# Altium footprint library EMDC_Packages.PcbLib: 274 footprints (part 7 of 18)
Each footprint in its own frame and in the unit in brackets; x right, y up, seen from the top. Pads: shape width x height; smd on the part's side, far side on the other; paste and mask are expansions set on the pad; w line width, h text height; cw(c..) or ccw(c..) is an arc to the next point about the centre after c.
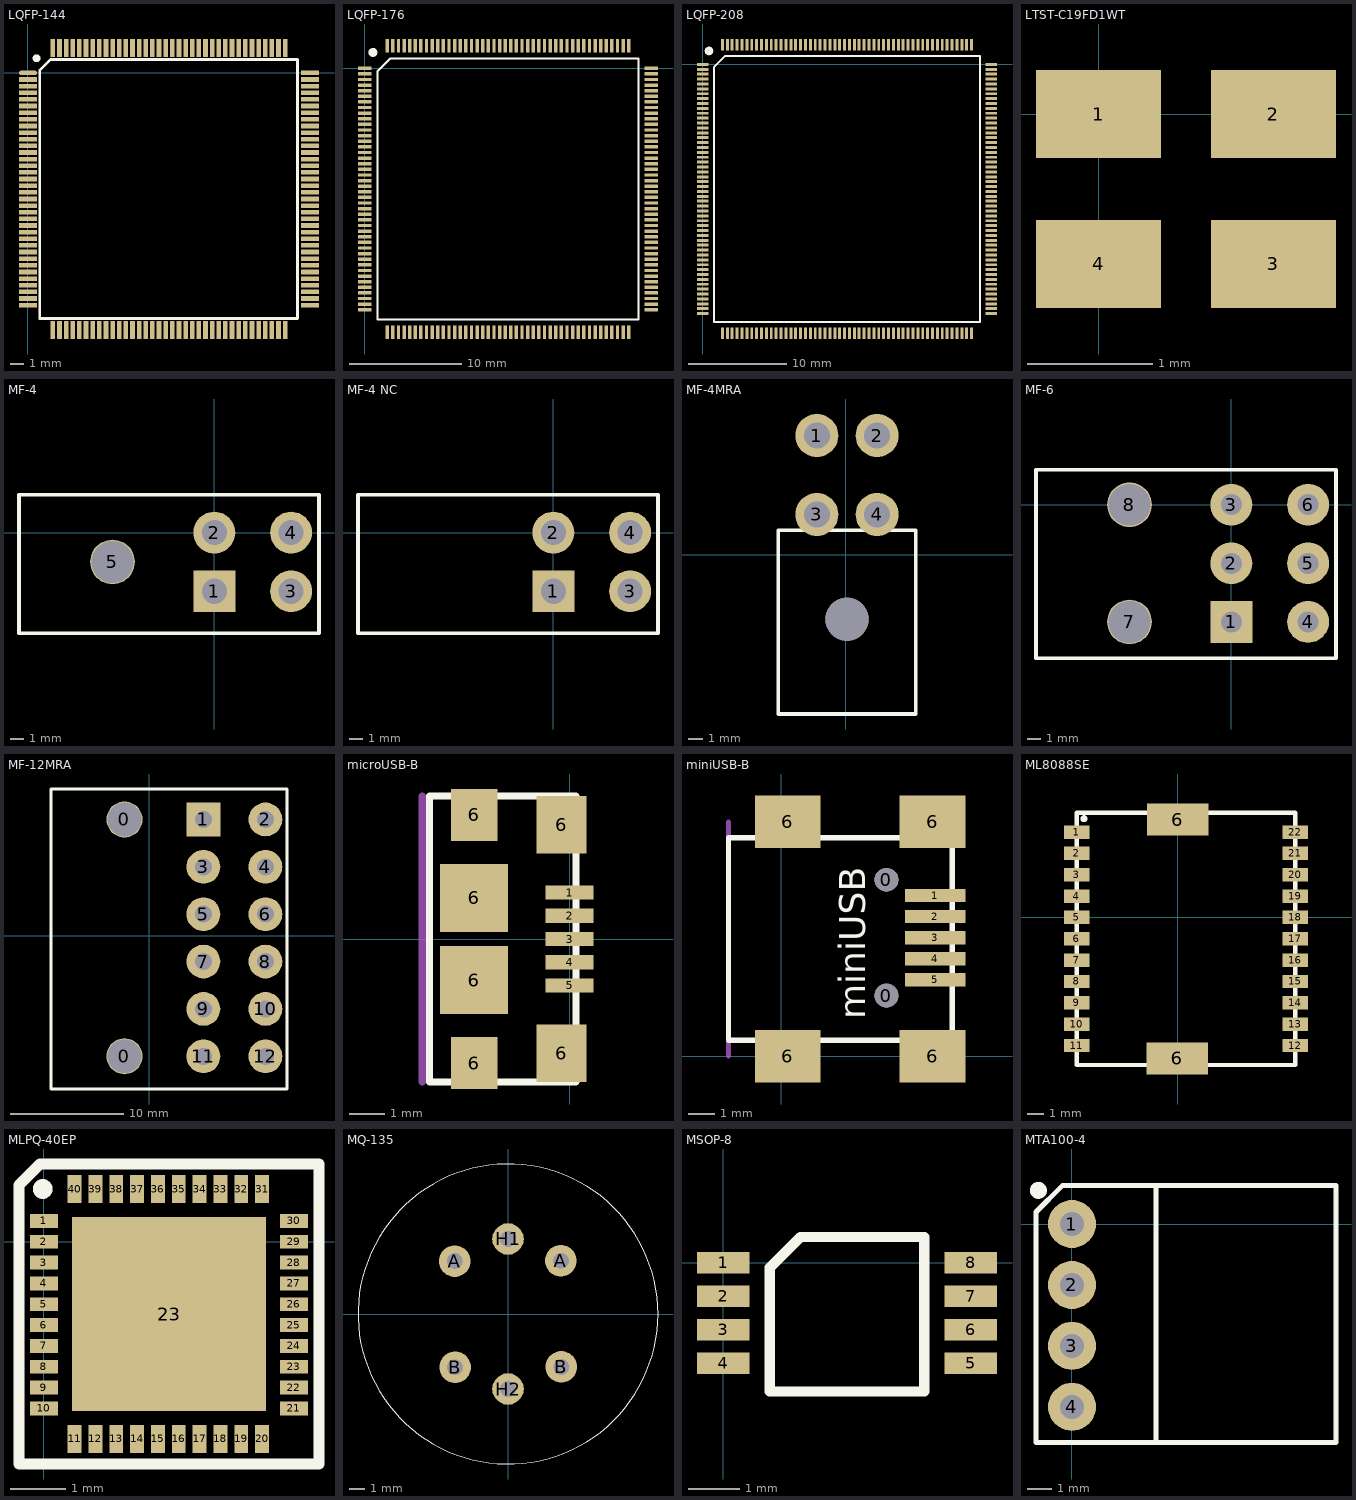
[diagram p6: the footprints below, top view; thin cyan lines are the x and y axes]

## LQFP-144 [mm]
pads (144):
  oval 1.35x0.35 smd: 1(0,0)
  rect 1.35x0.35 smd: 2(0,-0.5) 3(0,-1) 4(0,-1.5) 5(0,-2) 6(0,-2.5) 7(0,-3) 8(0,-3.5) 9(0,-4) 10(0,-4.5) 11(0,-5) 12(0,-5.5) 13(0,-6) 14(0,-6.5) 15(0,-7) 16(0,-7.5) 17(0,-8) 18(0,-8.5) 19(0,-9) 20(0,-9.5) 21(0,-10) 22(0,-10.5) 23(0,-11) 24(0,-11.5) 25(0,-12) 26(0,-12.5) 27(0,-13) 28(0,-13.5) 29(0,-14) 30(0,-14.5) 31(0,-15) 32(0,-15.5) 33(0,-16) 34(0,-16.5) 35(0,-17) 36(0,-17.5) 73(21.25,-17.5) 74(21.25,-17) 75(21.25,-16.5) 76(21.25,-16) 77(21.25,-15.5) 78(21.25,-15) 79(21.25,-14.5) 80(21.25,-14) 81(21.25,-13.5) 82(21.25,-13) 83(21.25,-12.5) 84(21.25,-12) 85(21.25,-11.5) 86(21.25,-11) 87(21.25,-10.5) 88(21.25,-10) 89(21.25,-9.5) 90(21.25,-9) 91(21.25,-8.5) 92(21.25,-8) 93(21.25,-7.5) 94(21.25,-7) 95(21.25,-6.5) 96(21.25,-6) 97(21.25,-5.5) 98(21.25,-5) 99(21.25,-4.5) 100(21.25,-4) 101(21.25,-3.5) 102(21.25,-3) 103(21.25,-2.5) 104(21.25,-2) 105(21.25,-1.5) 106(21.25,-1) 107(21.25,-0.5) 108(21.25,0)
  rect 0.35x1.35 smd: 37(1.875,-19.375) 38(2.375,-19.375) 39(2.875,-19.375) 40(3.375,-19.375) 41(3.875,-19.375) 42(4.375,-19.375) 43(4.875,-19.375) 44(5.375,-19.375) 45(5.875,-19.375) 46(6.375,-19.375) 47(6.875,-19.375) 48(7.375,-19.375) 49(7.875,-19.375) 50(8.375,-19.375) 51(8.875,-19.375) 52(9.375,-19.375) 53(9.875,-19.375) 54(10.375,-19.375) 55(10.875,-19.375) 56(11.375,-19.375) 57(11.875,-19.375) 58(12.375,-19.375) 59(12.875,-19.375) 60(13.375,-19.375) 61(13.875,-19.375) 62(14.375,-19.375) 63(14.875,-19.375) 64(15.375,-19.375) 65(15.875,-19.375) 66(16.375,-19.375) 67(16.875,-19.375) 68(17.375,-19.375) 69(17.875,-19.375) 70(18.375,-19.375) 71(18.875,-19.375) 72(19.375,-19.375) 109(19.375,1.875) 110(18.875,1.875) 111(18.375,1.875) 112(17.875,1.875) 113(17.375,1.875) 114(16.875,1.875) 115(16.375,1.875) 116(15.875,1.875) 117(15.375,1.875) 118(14.875,1.875) 119(14.375,1.875) 120(13.875,1.875) 121(13.375,1.875) 122(12.875,1.875) 123(12.375,1.875) 124(11.875,1.875) 125(11.375,1.875) 126(10.875,1.875) 127(10.375,1.875) 128(9.875,1.875) 129(9.375,1.875) 130(8.875,1.875) 131(8.375,1.875) 132(7.875,1.875) 133(7.375,1.875) 134(6.875,1.875) 135(6.375,1.875) 136(5.875,1.875) 137(5.375,1.875) 138(4.875,1.875) 139(4.375,1.875) 140(3.875,1.875) 141(3.375,1.875) 142(2.875,1.875) 143(2.375,1.875) 144(1.875,1.875)
Top Overlay:
  circle w0.3: c0.65,1.1 r0.15
  lines w0.2: 0.9,-18.5 20.3,-18.5 20.3,1 1.7,1 0.9,0.2 0.9,-18.5
3D body "User Library-LQFP144-0_5.step": height 1.56, standoff -0.01, extent -0.25,-19.625 21.522,2.147

## LQFP-176 [mm]
pads (176):
  rect 1.2x0.3 smd: 1(0,0) 2(0,-0.5) 3(0,-1) 4(0,-1.5) 5(0,-2) 6(0,-2.5) 7(0,-3) 8(0,-3.5) 9(0,-4) 10(0,-4.5) 11(0,-5) 12(0,-5.5) 13(0,-6) 14(0,-6.5) 15(0,-7) 16(0,-7.5) 17(0,-8) 18(0,-8.5) 19(0,-9) 20(0,-9.5) 21(0,-10) 22(0,-10.5) 23(0,-11) 24(0,-11.5) 25(0,-12) 26(0,-12.5) 27(0,-13) 28(0,-13.5) 29(0,-14) 30(0,-14.5) 31(0,-15) 32(0,-15.5) 33(0,-16) 34(0,-16.5) 35(0,-17) 36(0,-17.5) 37(0,-18) 38(0,-18.5) 39(0,-19) 40(0,-19.5) 41(0,-20) 42(0,-20.5) 43(0,-21) 44(0,-21.5) 89(25.5,-21.5) 90(25.5,-21) 91(25.5,-20.5) 92(25.5,-20) 93(25.5,-19.5) 94(25.5,-19) 95(25.5,-18.5) 96(25.5,-18) 97(25.5,-17.5) 98(25.5,-17) 99(25.5,-16.5) 100(25.5,-16) 101(25.5,-15.5) 102(25.5,-15) 103(25.5,-14.5) 104(25.5,-14) 105(25.5,-13.5) 106(25.5,-13) 107(25.5,-12.5) 108(25.5,-12) 109(25.5,-11.5) 110(25.5,-11) 111(25.5,-10.5) 112(25.5,-10) 113(25.5,-9.5) 114(25.5,-9) 115(25.5,-8.5) 116(25.5,-8) 117(25.5,-7.5) 118(25.5,-7) 119(25.5,-6.5) 120(25.5,-6) 121(25.5,-5.5) 122(25.5,-5) 123(25.5,-4.5) 124(25.5,-4) 125(25.5,-3.5) 126(25.5,-3) 127(25.5,-2.5) 128(25.5,-2) 129(25.5,-1.5) 130(25.5,-1) 131(25.5,-0.5) 132(25.5,0)
  rect 0.3x1.2 smd: 45(2,-23.5) 46(2.5,-23.5) 47(3,-23.5) 48(3.5,-23.5) 49(4,-23.5) 50(4.5,-23.5) 51(5,-23.5) 52(5.5,-23.5) 53(6,-23.5) 54(6.5,-23.5) 55(7,-23.5) 56(7.5,-23.5) 57(8,-23.5) 58(8.5,-23.5) 59(9,-23.5) 60(9.5,-23.5) 61(10,-23.5) 62(10.5,-23.5) 63(11,-23.5) 64(11.5,-23.5) 65(12,-23.5) 66(12.5,-23.5) 67(13,-23.5) 68(13.5,-23.5) 69(14,-23.5) 70(14.5,-23.5) 71(15,-23.5) 72(15.5,-23.5) 73(16,-23.5) 74(16.5,-23.5) 75(17,-23.5) 76(17.5,-23.5) 77(18,-23.5) 78(18.5,-23.5) 79(19,-23.5) 80(19.5,-23.5) 81(20,-23.5) 82(20.5,-23.5) 83(21,-23.5) 84(21.5,-23.5) 85(22,-23.5) 86(22.5,-23.5) 87(23,-23.5) 88(23.5,-23.5) 133(23.5,2) 134(23,2) 135(22.5,2) 136(22,2) 137(21.5,2) 138(21,2) 139(20.5,2) 140(20,2) 141(19.5,2) 142(19,2) 143(18.5,2) 144(18,2) 145(17.5,2) 146(17,2) 147(16.5,2) 148(16,2) 149(15.5,2) 150(15,2) 151(14.5,2) 152(14,2) 153(13.5,2) 154(13,2) 155(12.5,2) 156(12,2) 157(11.5,2) 158(11,2) 159(10.5,2) 160(10,2) 161(9.5,2) 162(9,2) 163(8.5,2) 164(8,2) 165(7.5,2) 166(7,2) 167(6.5,2) 168(6,2) 169(5.5,2) 170(5,2) 171(4.5,2) 172(4,2) 173(3.5,2) 174(3,2) 175(2.5,2) 176(2,2)
Top Overlay:
  circle w0.2: c0.725,1.4 r0.112
  circle w0.2: c0.725,1.4 r0.3
  lines w0.2: 1.135,-22.365 1.135,-0.27 2.27,0.865 24.365,0.865 24.365,-22.365 1.135,-22.365
3D body "User Library-LQFP176-0_5.step": height 1.55, standoff -0.02, extent -0.136,-23.636 25.636,2.136

## LQFP-208 [mm]
pads (208):
  rect 1.2x0.3 smd: 1(0,0) 2(0,-0.5) 3(0,-1) 4(0,-1.5) 5(0,-2) 6(0,-2.5) 7(0,-3) 8(0,-3.5) 9(0,-4) 10(0,-4.5) 11(0,-5) 12(0,-5.5) 13(0,-6) 14(0,-6.5) 15(0,-7) 16(0,-7.5) 17(0,-8) 18(0,-8.5) 19(0,-9) 20(0,-9.5) 21(0,-10) 22(0,-10.5) 23(0,-11) 24(0,-11.5) 25(0,-12) 26(0,-12.5) 27(0,-13) 28(0,-13.5) 29(0,-14) 30(0,-14.5) 31(0,-15) 32(0,-15.5) 33(0,-16) 34(0,-16.5) 35(0,-17) 36(0,-17.5) 37(0,-18) 38(0,-18.5) 39(0,-19) 40(0,-19.5) 41(0,-20) 42(0,-20.5) 43(0,-21) 44(0,-21.5) 45(0,-22) 46(0,-22.5) 47(0,-23) 48(0,-23.5) 49(0,-24) 50(0,-24.5) 51(0,-25) 52(0,-25.5) 105(29.5,-25.5) 106(29.5,-25) 107(29.5,-24.5) 108(29.5,-24) 109(29.5,-23.5) 110(29.5,-23) 111(29.5,-22.5) 112(29.5,-22) 113(29.5,-21.5) 114(29.5,-21) 115(29.5,-20.5) 116(29.5,-20) 117(29.5,-19.5) 118(29.5,-19) 119(29.5,-18.5) 120(29.5,-18) 121(29.5,-17.5) 122(29.5,-17) 123(29.5,-16.5) 124(29.5,-16) 125(29.5,-15.5) 126(29.5,-15) 127(29.5,-14.5) 128(29.5,-14) 129(29.5,-13.5) 130(29.5,-13) 131(29.5,-12.5) 132(29.5,-12) 133(29.5,-11.5) 134(29.5,-11) 135(29.5,-10.5) 136(29.5,-10) 137(29.5,-9.5) 138(29.5,-9) 139(29.5,-8.5) 140(29.5,-8) 141(29.5,-7.5) 142(29.5,-7) 143(29.5,-6.5) 144(29.5,-6) 145(29.5,-5.5) 146(29.5,-5) 147(29.5,-4.5) 148(29.5,-4) 149(29.5,-3.5) 150(29.5,-3) 151(29.5,-2.5) 152(29.5,-2) 153(29.5,-1.5) 154(29.5,-1) 155(29.5,-0.5) 156(29.5,0)
  rect 0.3x1.2 smd: 53(2,-27.5) 54(2.5,-27.5) 55(3,-27.5) 56(3.5,-27.5) 57(4,-27.5) 58(4.5,-27.5) 59(5,-27.5) 60(5.5,-27.5) 61(6,-27.5) 62(6.5,-27.5) 63(7,-27.5) 64(7.5,-27.5) 65(8,-27.5) 66(8.5,-27.5) 67(9,-27.5) 68(9.5,-27.5) 69(10,-27.5) 70(10.5,-27.5) 71(11,-27.5) 72(11.5,-27.5) 73(12,-27.5) 74(12.5,-27.5) 75(13,-27.5) 76(13.5,-27.5) 77(14,-27.5) 78(14.5,-27.5) 79(15,-27.5) 80(15.5,-27.5) 81(16,-27.5) 82(16.5,-27.5) 83(17,-27.5) 84(17.5,-27.5) 85(18,-27.5) 86(18.5,-27.5) 87(19,-27.5) 88(19.5,-27.5) 89(20,-27.5) 90(20.5,-27.5) 91(21,-27.5) 92(21.5,-27.5) 93(22,-27.5) 94(22.5,-27.5) 95(23,-27.5) 96(23.5,-27.5) 97(24,-27.5) 98(24.5,-27.5) 99(25,-27.5) 100(25.5,-27.5) 101(26,-27.5) 102(26.5,-27.5) 103(27,-27.5) 104(27.5,-27.5) 157(27.5,2) 158(27,2) 159(26.5,2) 160(26,2) 161(25.5,2) 162(25,2) 163(24.5,2) 164(24,2) 165(23.5,2) 166(23,2) 167(22.5,2) 168(22,2) 169(21.5,2) 170(21,2) 171(20.5,2) 172(20,2) 173(19.5,2) 174(19,2) 175(18.5,2) 176(18,2) 177(17.5,2) 178(17,2) 179(16.5,2) 180(16,2) 181(15.5,2) 182(15,2) 183(14.5,2) 184(14,2) 185(13.5,2) 186(13,2) 187(12.5,2) 188(12,2) 189(11.5,2) 190(11,2) 191(10.5,2) 192(10,2) 193(9.5,2) 194(9,2) 195(8.5,2) 196(8,2) 197(7.5,2) 198(7,2) 199(6.5,2) 200(6,2) 201(5.5,2) 202(5,2) 203(4.5,2) 204(4,2) 205(3.5,2) 206(3,2) 207(2.5,2) 208(2,2)
Top Overlay:
  circle w0.2: c0.625,1.375 r0.34
  circle w0.2: c0.625,1.375 r0.146
  lines w0.2: 1.135,-26.365 1.135,-0.27 2.27,0.865 28.365,0.865 28.365,-26.365 1.135,-26.365
3D body "User Library-TQFP-208-1.step": height 3.5, standoff 0, extent -0.543,-28.043 30.043,2.543

## LTST-C19FD1WT [mm] "RGB LED LightOn"
pads (4):
  rect 1x0.7 smd: 1(0,0) 2(1.4,0) 3(1.4,-1.2) 4(0,-1.2)

## MF-4 [mm] "MOLEX MiniFit 4 Male Connector"
height 10
pads (5):
  rect 3x3 hole 1.8: 1(0,-4.2)
  round 3 hole 1.8: 2(0,0) 3(5.5,-4.2) 4(5.5,0)
  round 3.2 hole 3 unplated: 5(-7.3,-2.1)
Top Overlay:
  lines w0.254: -14,-7.2 7.5,-7.2 7.5,2.7 -14,2.7 -14,-7.2
3D body "MF-4MRA.stp": height 11.4, standoff -3.6, extent -13.9,-7.275 6.035,2.725

## MF-4 NC [mm] "MOLEX MiniFit 4 (no catch)"
height 10
pads (4):
  rect 3x3 hole 1.8: 1(0,-4.2)
  round 3 hole 1.8: 2(0,0) 3(5.5,-4.2) 4(5.5,0)
Top Overlay:
  lines w0.254: -14,-7.2 7.5,-7.2 7.5,2.7 -14,2.7 -14,-7.2
3D body "MF-4MRA.stp": height 11.4, standoff -3.6, extent -13.9,-7.275 6.035,2.725

## MF-4MRA [mm]
pads (5):
  round 3 hole 1.8: 1(-2,8.3) 2(2.2,8.3) 3(-2,2.8) 4(2.2,2.8)
  round 3 hole 3: ""(0.1,-4.5)
Top Overlay:
  lines w0.254: -4.7,-11.1 4.9,-11.1 4.9,1.7 -4.7,1.7 -4.7,-11.1
3D body "MF-4MRA.stp": height 11.4, standoff -3.6, extent -4.725,-11.1 5.275,8.835

## MF-6 [mm] "MOLEX MiniFit 6 Male Connector"
height 10
pads (8):
  rect 3x3 hole 1.5: 1(0,-8.4)
  round 3 hole 1.5: 2(0,-4.2) 3(0,0) 4(5.5,-8.4) 5(5.5,-4.2) 6(5.5,0)
  round 3.2 hole 3 unplated: 7(-7.3,-8.4) 8(-7.3,0)
Top Overlay:
  lines w0.254: 7.5,-11 7.5,-11 ; 7.5,-11 7.5,2.5 -14,2.5 -14,-11 7.5,-11
3D body "MF-6MRA.stp": height 11.4, standoff -3.6, extent -13.9,-11.5 6.035,2.7

## MF-12MRA [mm]
pads (14):
  round 3.2 hole 3 unplated: 0(-2.2,-10.7) 0(-2.2,10.3)
  rect 3x3 hole 1.5: 1(4.8,10.3)
  round 3 hole 1.5: 2(10.3,10.3) 3(4.8,6.1) 4(10.3,6.1) 5(4.8,1.9) 6(10.3,1.9) 7(4.8,-2.3) 8(10.3,-2.3) 9(4.8,-6.5) 10(10.3,-6.5) 11(4.8,-10.7) 12(10.3,-10.7)
Top Overlay:
  lines w0.254: -8.7,-13.6 -8.7,13 12.2,13 12.2,-13.6 -8.7,-13.6 ; -8.7,-13.6 -8.7,-13.6

## microUSB-B [mm]
pads (11):
  rect 1.35x0.4 smd paste+0: 1(0,1.3) 2(0,0.65) 3(0,0) 4(0,-0.65) 5(0,-1.3)
  rect 1.9x1.9 smd paste+0: 6(-2.675,-1.15)
  rect 1.9x1.9 smd: 6(-2.675,1.15)
  rect 1.3x1.45 smd paste+0: 6(-2.675,3.475) 6(-2.675,-3.475)
  rect 1.4x1.6 smd paste+0: 6(-0.225,-3.2) 6(-0.225,3.2)
Top Overlay:
  lines w0.2: -3.925,-4 0.175,-4 0.175,4 -3.925,4 -3.925,-4
Mechanical 1:
  lines w0.2: -4.125,-4 -4.125,4
3D body "c-1981568-1-g-3d.stp": height 2.74, standoff -0.34, extent -5.425,-4 0.175,4

## miniUSB-B [mm] "miniUSB type B 5 pin"
pads (11):
  round 0.9 hole 0.9 unplated paste+0 mask+0: 0(4,2.3) 0(4,6.7)
  rect 2.3x0.5 smd paste+0: 1(5.85,6.1) 2(5.85,5.3) 3(5.85,4.5) 4(5.85,3.7) 5(5.85,2.9)
  rect 2.5x2 smd paste+0: 6(0.25,0) 6(0.25,8.9) 6(5.75,0) 6(5.75,8.9)
Top Overlay:
  lines w0.2: -2,0.6 6.5,0.6 6.5,8.3 -2,8.3 -2,0.6
  text "miniUSB" at 3.2,1.4 h1
Mechanical 1:
  lines w0.2: -2,0 -2,8.9
3D body "usb_a-usb_b-m5-smd-c.stp": height 3.93, standoff -1, extent -2.25,-0.3 7,9.6

## ML8088SE [mm]
pads (24):
  rect 1.5x0.8 smd: 1(-6,5.08) 2(-6,3.81) 3(-6,2.54) 4(-6,1.27) 5(-6,0) 6(-6,-1.27) 7(-6,-2.54) 8(-6,-3.81) 9(-6,-5.08) 10(-6,-6.35) 11(-6,-7.62) 12(7,-7.62) 13(7,-6.35) 14(7,-5.08) 15(7,-3.81) 16(7,-2.54) 17(7,-1.27) 18(7,0) 19(7,1.27) 20(7,2.54) 21(7,3.81) 22(7,5.08)
  rect 3.65x1.9 smd: 6(-0.025,-8.382) 6(0,5.817)
Top Overlay:
  circle w0.254: c-5.575,5.875 r0.079
  lines w0.254: -6,-8.775 -6,6.225 7,6.225 7,-8.775 -6,-8.775

## MLPQ-40EP [mm]
pads (41):
  rect 0.5x0.25 smd: 1(0,0.375) 2(0,0) 3(0,-0.375) 4(0,-0.75) 5(0,-1.125) 6(0,-1.5) 7(0,-1.875) 8(0,-2.25) 9(0,-2.625) 10(0,-3) 21(4.5,-3) 22(4.5,-2.625) 23(4.5,-2.25) 24(4.5,-1.875) 25(4.5,-1.5) 26(4.5,-1.125) 27(4.5,-0.75) 28(4.5,-0.375) 29(4.5,0) 30(4.5,0.375)
  rect 0.25x0.5 smd: 11(0.55,-3.55) 12(0.925,-3.55) 13(1.3,-3.55) 14(1.675,-3.55) 15(2.05,-3.55) 16(2.425,-3.55) 17(2.8,-3.55) 18(3.175,-3.55) 19(3.55,-3.55) 20(3.925,-3.55) 31(3.925,0.95) 32(3.55,0.95) 33(3.175,0.95) 34(2.8,0.95) 35(2.425,0.95) 36(2.05,0.95) 37(1.675,0.95) 38(1.3,0.95) 39(0.925,0.95) 40(0.55,0.95)
  rect 3.5x3.5 smd: 23(2.25,-1.3)
Top Overlay:
  circle w0.254: c-0.025,0.95 r0.05
  lines w0.2: -0.45,-4 4.95,-4 4.95,1.212 4.95,1.4 -0.075,1.4 -0.45,1.025 -0.45,-4
3D body "User Library-QFN 40 5x5.STEP": height 0.73, standoff -0.02, extent -0.251,-3.801 4.751,1.201

## MQ-135 [mm]
pads (6):
  round 2 hole 1: A(-3.375,3.35) A(3.35,3.375) B(-3.35,-3.375) B(3.375,-3.35) H1(0,4.75) H2(0,-4.75)
Top Overlay:
  circle w0.05: c0,0 r9.5
3D body "User Library-MQ135.step": height 14, standoff -7.5, extent -9.75,-9.75 9.75,9.75

## MSOP-8 [mm]
pads (8):
  rect 1.02x0.41 smd: 1(0,0) 2(0,-0.65) 3(0,-1.3) 4(0,-1.95) 5(4.8,-1.95) 6(4.8,-1.3) 7(4.8,-0.65) 8(4.8,0)
Top Overlay:
  lines w0.2: 0.9,-2.5 3.9,-2.5 3.9,0.5 1.5,0.5 0.9,-0.1 0.9,-2.5
3D body "User Library-msop-8.STEP": height 1.15, standoff 0, extent -0.05,-2.5 4.85,0.5

## MTA100-4 [mm] "TE Connectivity MTA100-4 connector on board"
pads (4):
  round 2 hole 1: 1(0,0) 2(0,-2.54) 3(0,-5.08) 4(0,-7.62)
Top Overlay:
  circle w0.5: c-1.4,1.4 r0.1
  lines w0.2: 3.5,-9 3.5,1.5 ; -1.5,-9.1 -1.5,0.5 -0.4,1.6 2.5,1.6 11,1.6 11,-9.1 2.5,-9.1 -1.5,-9.1
3D body "c-0640457-04-s-3d.stp": height 5.87, standoff -3.52, extent -0.306,-8.83 10.743,1.33